# Altium footprint library WR-TBL_Spring Clamp.PcbLib: 258 footprints (part 7 of 17)
Each footprint in its own frame and in the unit in brackets; x right, y up, seen from the top. Pads: shape width x height; smd on the part's side, far side on the other; paste and mask are expansions set on the pad; w line width, h text height; cw(c..) or ccw(c..) is an arc to the next point about the centre after c.
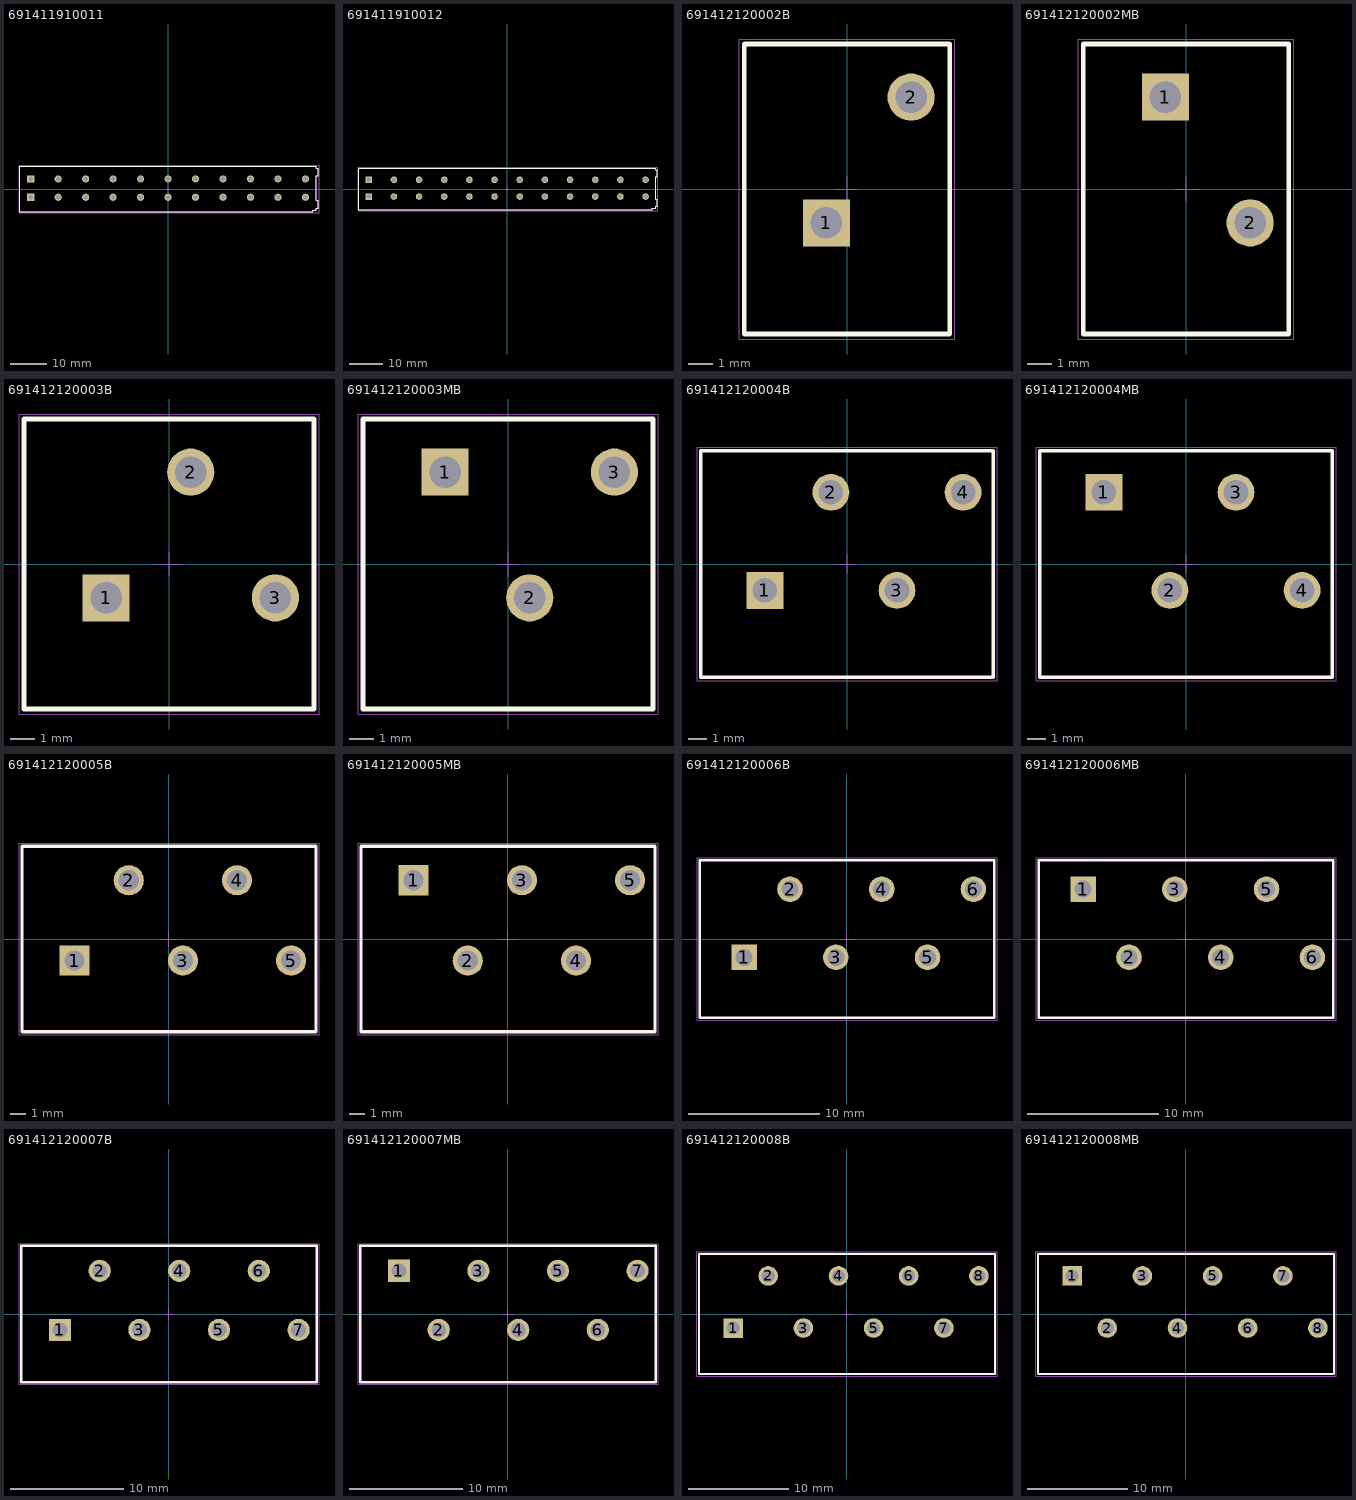
[diagram p6: the footprints below, top view; thin cyan lines are the x and y axes]

## 691411910011 [mm] "7.50 mm Screwless Horizontal Entry, 11p"
height 13.9
pads (22):
  rect 1.95x1.95 hole 1.3: 1(-37.5,-2.25) 1(-37.5,2.75)
  round 1.95 hole 1.3: 2(-30,-2.25) 2(-30,2.75) 3(-22.5,-2.25) 3(-22.5,2.75) 4(-15,-2.25) 4(-15,2.75) 5(-7.5,-2.25) 5(-7.5,2.75) 6(0,-2.25) 6(0,2.75) 7(7.5,-2.25) 7(7.5,2.75) 8(15,-2.25) 8(15,2.75) 9(22.5,-2.25) 9(22.5,2.75) 10(30,-2.25) 10(30,2.75) 11(37.5,-2.25) 11(37.5,2.75)
Top Overlay:
  lines w0.2: -40.5,-6.25 -40.5,6.25 40.5,6.25 40.5,5.7 41,5.7 41,3.6 40.5,3.6 40.5,-3.1 41,-3.1 41,-5.2 40.5,-5.2 40.5,-5.75 39.5,-5.75 39.5,-6.25 -40.5,-6.25
Mechanical 13:
  lines w0.1: -40.5,-6.25 39.5,-6.25 39.5,-5.75 40.5,-5.75 40.5,-5.2 41,-5.2 41,-3.1 40.5,-3.1 40.5,3.6 41,3.6 41,5.7 40.5,5.7 40.5,6.25 -40.5,6.25 -40.5,-6.25
Mechanical 15:
  lines w0.05: -0.5,0 0.5,0 ; 0,-0.5 0,0.5 ; -40.7,-6.45 -40.7,6.45 41.2,6.45 41.2,-6.45 -40.7,-6.45
3D body "691411910011.stp": height 13.95, standoff -3.55, extent -40.5,-6.25 41,6.25

## 691411910012 [mm] "7.50 mm Screwless Horizontal Entry, 12p"
height 13.9
pads (24):
  rect 1.95x1.95 hole 1.3: 1(-41.25,-2.25) 1(-41.25,2.75)
  round 1.95 hole 1.3: 2(-33.75,-2.25) 2(-33.75,2.75) 3(-26.25,-2.25) 3(-26.25,2.75) 4(-18.75,-2.25) 4(-18.75,2.75) 5(-11.25,-2.25) 5(-11.25,2.75) 6(-3.75,-2.25) 6(-3.75,2.75) 7(3.75,-2.25) 7(3.75,2.75) 8(11.25,-2.25) 8(11.25,2.75) 9(18.75,-2.25) 9(18.75,2.75) 10(26.25,-2.25) 10(26.25,2.75) 11(33.75,-2.25) 11(33.75,2.75) 12(41.25,-2.25) 12(41.25,2.75)
Top Overlay:
  lines w0.2: -44.25,-6.25 43.25,-6.25 43.25,-5.75 44.25,-5.75 44.25,-5.2 44.75,-5.2 44.75,-3.1 44.25,-3.1 44.25,3.6 44.75,3.6 44.75,5.7 44.25,5.7 44.25,6.25 -44.25,6.25 -44.25,-6.25
Mechanical 13:
  lines w0.1: -44.25,-6.25 -44.25,6.25 44.25,6.25 44.25,5.7 44.75,5.7 44.75,3.6 44.25,3.6 44.25,-3.1 44.75,-3.1 44.75,-5.2 44.25,-5.2 44.25,-5.75 43.25,-5.75 43.25,-6.25 -44.25,-6.25
Mechanical 15:
  lines w0.05: -0.5,0 0.5,0 ; 0,-0.5 0,0.5 ; -44.45,-6.45 44.95,-6.45 44.95,6.45 -44.45,6.45 -44.45,-6.45
3D body "691411910012.stp": height 13.95, standoff -3.55, extent -44.25,-6.25 44.75,6.25

## 691412120002B [mm] "3,5mm - Spring clamp/Screw less - 45° entry - 02p"
height 12.8
pads (2):
  rect 1.95x1.95 hole 1.3: 1(-0.85,-1.4)
  round 1.95 hole 1.3: 2(2.65,3.8)
Top Overlay:
  lines w0.2: -4.25,-6 -4.25,6 4.25,6 4.25,-6 -4.25,-6
Mechanical 13:
  lines w0.1: -4.25,-6 4.25,-6 4.25,6 -4.25,6 -4.25,-6
Mechanical 15:
  lines w0.05: -0.5,0 0.5,0 ; 0,-0.5 0,0.5 ; -4.45,-6.2 -4.45,6.2 4.45,6.2 4.45,-6.2 -4.45,-6.2
3D body "691412120002B.stp": height 12.85, standoff -3.45, extent -4.25,-6 4.25,6

## 691412120002MB [mm] "3,5mm - Spring clamp/Screw less - 45° entry - 02p"
height 11.5
pads (2):
  rect 1.95x1.95 hole 1.3: 1(-0.85,3.8)
  round 1.95 hole 1.3: 2(2.65,-1.4)
Top Overlay:
  lines w0.2: -4.25,-6 4.25,-6 4.25,6 -4.25,6 -4.25,-6
Mechanical 13:
  lines w0.1: -4.25,-6 -4.25,6 4.25,6 4.25,-6 -4.25,-6
Mechanical 15:
  lines w0.05: -0.5,0 0.5,0 ; 0,-0.5 0,0.5 ; -4.45,-6.2 -4.45,6.2 4.45,6.2 4.45,-6.2 -4.45,-6.2
3D body "691412120002MB.stp": height 12.85, standoff -3.45, extent -4.25,-6 4.25,6

## 691412120003B [mm] "3,5mm - Spring clamp/Screw less - 45° entry - 03p"
height 12.8
pads (3):
  rect 1.95x1.95 hole 1.3: 1(-2.6,-1.4)
  round 1.95 hole 1.3: 2(0.9,3.8) 3(4.4,-1.4)
Top Overlay:
  lines w0.2: -6,-6 6,-6 6,6 -6,6 -6,-6
Mechanical 13:
  lines w0.1: -6,-6 -6,6 6,6 6,-6 -6,-6
Mechanical 15:
  lines w0.05: -0.5,0 0.5,0 ; 0,-0.5 0,0.5 ; -6.2,-6.2 6.2,-6.2 6.2,6.2 -6.2,6.2 -6.2,-6.2
3D body "691412120003B.stp": height 12.85, standoff -3.45, extent -6,-6 6,6

## 691412120003MB [mm] "3,5mm - Spring clamp/Screw less - 45° entry - 03p"
height 11.5
pads (3):
  rect 1.95x1.95 hole 1.3: 1(-2.6,3.8)
  round 1.95 hole 1.3: 2(0.9,-1.4) 3(4.4,3.8)
Top Overlay:
  lines w0.2: -6,-6 -6,6 6,6 6,-6 -6,-6
Mechanical 13:
  lines w0.1: -6,-6 6,-6 6,6 -6,6 -6,-6
Mechanical 15:
  lines w0.05: -0.5,0 0.5,0 ; 0,-0.5 0,0.5 ; -6.2,-6.2 6.2,-6.2 6.2,6.2 -6.2,6.2 -6.2,-6.2
3D body "691412120003MB.stp": height 12.85, standoff -3.45, extent -6,-6 6,6

## 691412120004B [mm] "3,5mm - Spring clamp/Screw less - 45° entry - 04p"
height 12.8
pads (4):
  rect 1.95x1.95 hole 1.3: 1(-4.35,-1.4)
  round 1.95 hole 1.3: 2(-0.85,3.8) 3(2.65,-1.4) 4(6.15,3.8)
Top Overlay:
  lines w0.2: -7.75,-6 7.75,-6 7.75,6 -7.75,6 -7.75,-6
Mechanical 13:
  lines w0.1: -7.75,-6 -7.75,6 7.75,6 7.75,-6 -7.75,-6
Mechanical 15:
  lines w0.05: -0.5,0 0.5,0 ; 0,-0.5 0,0.5 ; -7.95,-6.2 7.95,-6.2 7.95,6.2 -7.95,6.2 -7.95,-6.2
3D body "691412120004B.stp": height 12.85, standoff -3.45, extent -7.75,-6 7.75,6

## 691412120004MB [mm] "3,5mm - Spring clamp/Screw less - 45° entry - 04p"
height 11.5
pads (4):
  rect 1.95x1.95 hole 1.3: 1(-4.35,3.8)
  round 1.95 hole 1.3: 2(-0.85,-1.4) 3(2.65,3.8) 4(6.15,-1.4)
Top Overlay:
  lines w0.2: -7.75,-6 -7.75,6 7.75,6 7.75,-6 -7.75,-6
Mechanical 13:
  lines w0.1: -7.75,-6 7.75,-6 7.75,6 -7.75,6 -7.75,-6
Mechanical 15:
  lines w0.05: -0.5,0 0.5,0 ; 0,-0.5 0,0.5 ; -7.95,-6.2 7.95,-6.2 7.95,6.2 -7.95,6.2 -7.95,-6.2
3D body "691412120004MB.stp": height 12.85, standoff -3.45, extent -7.75,-6 7.75,6

## 691412120005B [mm] "3,5mm - Spring clamp/Screw less - 45° entry - 05p"
height 12.8
pads (5):
  rect 1.95x1.95 hole 1.3: 1(-6.1,-1.4)
  round 1.95 hole 1.3: 2(-2.6,3.8) 3(0.9,-1.4) 4(4.4,3.8) 5(7.9,-1.4)
Top Overlay:
  lines w0.2: -9.5,-6 9.5,-6 9.5,6 -9.5,6 -9.5,-6
Mechanical 13:
  lines w0.1: -9.5,-6 -9.5,6 9.5,6 9.5,-6 -9.5,-6
Mechanical 15:
  lines w0.05: -0.5,0 0.5,0 ; 0,-0.5 0,0.5 ; -9.7,-6.2 9.7,-6.2 9.7,6.2 -9.7,6.2 -9.7,-6.2
3D body "691412120005B.stp": height 12.85, standoff -3.45, extent -9.5,-6 9.5,6

## 691412120005MB [mm] "3,5mm - Spring clamp/Screw less - 45° entry - 05p"
height 11.5
pads (5):
  rect 1.95x1.95 hole 1.3: 1(-6.1,3.8)
  round 1.95 hole 1.3: 2(-2.6,-1.4) 3(0.9,3.8) 4(4.4,-1.4) 5(7.9,3.8)
Top Overlay:
  lines w0.2: -9.5,-6 9.5,-6 9.5,6 -9.5,6 -9.5,-6
Mechanical 13:
  lines w0.1: -9.5,-6 -9.5,6 9.5,6 9.5,-6 -9.5,-6
Mechanical 15:
  lines w0.05: -0.5,0 0.5,0 ; 0,-0.5 0,0.5 ; -9.7,-6.2 -9.7,6.2 9.7,6.2 9.7,-6.2 -9.7,-6.2
3D body "691412120005MB.stp": height 12.85, standoff -3.45, extent -9.5,-6 9.5,6

## 691412120006B [mm] "3,5mm - Spring clamp/Screw less - 45° entry - 06p"
height 12.8
pads (6):
  rect 1.95x1.95 hole 1.3: 1(-7.85,-1.4)
  round 1.95 hole 1.3: 2(-4.35,3.8) 3(-0.85,-1.4) 4(2.65,3.8) 5(6.15,-1.4) 6(9.65,3.8)
Top Overlay:
  lines w0.2: -11.25,-6 11.25,-6 11.25,6 -11.25,6 -11.25,-6
Mechanical 13:
  lines w0.1: -11.25,-6 -11.25,6 11.25,6 11.25,-6 -11.25,-6
Mechanical 15:
  lines w0.05: -0.5,0 0.5,0 ; 0,-0.5 0,0.5 ; -11.45,-6.2 11.45,-6.2 11.45,6.2 -11.45,6.2 -11.45,-6.2
3D body "691412120006B.stp": height 12.85, standoff -3.45, extent -11.25,-6 11.25,6

## 691412120006MB [mm] "3,5mm - Spring clamp/Screw less - 45° entry - 06p"
height 11.5
pads (6):
  rect 1.95x1.95 hole 1.3: 1(-7.85,3.8)
  round 1.95 hole 1.3: 2(-4.35,-1.4) 3(-0.85,3.8) 4(2.65,-1.4) 5(6.15,3.8) 6(9.65,-1.4)
Top Overlay:
  lines w0.2: -11.25,-6 11.25,-6 11.25,6 -11.25,6 -11.25,-6
Mechanical 13:
  lines w0.1: -11.25,-6 -11.25,6 11.25,6 11.25,-6 -11.25,-6
Mechanical 15:
  lines w0.05: -0.5,0 0.5,0 ; 0,-0.5 0,0.5 ; -11.45,-6.2 -11.45,6.2 11.45,6.2 11.45,-6.2 -11.45,-6.2
3D body "691412120006MB.stp": height 12.85, standoff -3.45, extent -11.25,-6 11.25,6

## 691412120007B [mm] "3,5mm - Spring clamp/Screw less - 45° entry - 07p"
height 12.8
pads (7):
  rect 1.95x1.95 hole 1.3: 1(-9.6,-1.4)
  round 1.95 hole 1.3: 2(-6.1,3.8) 3(-2.6,-1.4) 4(0.9,3.8) 5(4.4,-1.4) 6(7.9,3.8) 7(11.4,-1.4)
Top Overlay:
  lines w0.2: -13,-6 -13,6 13,6 13,-6 -13,-6
Mechanical 13:
  lines w0.1: -13,-6 13,-6 13,6 -13,6 -13,-6
Mechanical 15:
  lines w0.05: -0.5,0 0.5,0 ; 0,-0.5 0,0.5 ; -13.2,-6.2 -13.2,6.2 13.2,6.2 13.2,-6.2 -13.2,-6.2
3D body "691412120007B.stp": height 12.85, standoff -3.45, extent -13,-6 13,6

## 691412120007MB [mm] "3,5mm - Spring clamp/Screw less - 45° entry - 07p"
height 11.5
pads (7):
  rect 1.95x1.95 hole 1.3: 1(-9.6,3.8)
  round 1.95 hole 1.3: 2(-6.1,-1.4) 3(-2.6,3.8) 4(0.9,-1.4) 5(4.4,3.8) 6(7.9,-1.4) 7(11.4,3.8)
Top Overlay:
  lines w0.2: -13,-6 13,-6 13,6 -13,6 -13,-6
Mechanical 13:
  lines w0.1: -13,-6 -13,6 13,6 13,-6 -13,-6
Mechanical 15:
  lines w0.05: -0.5,0 0.5,0 ; 0,-0.5 0,0.5 ; -13.2,-6.2 -13.2,6.2 13.2,6.2 13.2,-6.2 -13.2,-6.2
3D body "691412120007MB.stp": height 12.85, standoff -3.45, extent -13,-6 13,6

## 691412120008B [mm] "3,5mm - Spring clamp/Screw less - 45° entry - 08p"
height 12.8
pads (8):
  rect 1.95x1.95 hole 1.3: 1(-11.35,-1.4)
  round 1.95 hole 1.3: 2(-7.85,3.8) 3(-4.35,-1.4) 4(-0.85,3.8) 5(2.65,-1.4) 6(6.15,3.8) 7(9.65,-1.4) 8(13.15,3.8)
Top Overlay:
  lines w0.2: -14.75,-6 14.75,-6 14.75,6 -14.75,6 -14.75,-6
Mechanical 13:
  lines w0.1: -14.75,-6 -14.75,6 14.75,6 14.75,-6 -14.75,-6
Mechanical 15:
  lines w0.05: -0.5,0 0.5,0 ; 0,-0.5 0,0.5 ; -14.95,-6.2 14.95,-6.2 14.95,6.2 -14.95,6.2 -14.95,-6.2
3D body "691412120008B.stp": height 12.85, standoff -3.45, extent -14.75,-6 14.75,6

## 691412120008MB [mm] "3,5mm - Spring clamp/Screw less - 45° entry - 08p"
height 11.5
pads (8):
  rect 1.95x1.95 hole 1.3: 1(-11.35,3.8)
  round 1.95 hole 1.3: 2(-7.85,-1.4) 3(-4.35,3.8) 4(-0.85,-1.4) 5(2.65,3.8) 6(6.15,-1.4) 7(9.65,3.8) 8(13.15,-1.4)
Top Overlay:
  lines w0.2: -14.75,-6 -14.75,6 14.75,6 14.75,-6 -14.75,-6
Mechanical 13:
  lines w0.1: -14.75,-6 14.75,-6 14.75,6 -14.75,6 -14.75,-6
Mechanical 15:
  lines w0.05: -0.5,0 0.5,0 ; 0,-0.5 0,0.5 ; -14.95,-6.2 14.95,-6.2 14.95,6.2 -14.95,6.2 -14.95,-6.2
3D body "691412120008MB.stp": height 12.85, standoff -3.45, extent -14.75,-6 14.75,6